# Altium footprint library Custom_Case.PcbLib: 350 footprints (part 14 of 22)
Each footprint in its own frame and in the unit in brackets; x right, y up, seen from the top. Pads: shape width x height; smd on the part's side, far side on the other; paste and mask are expansions set on the pad; w line width, h text height; cw(c..) or ccw(c..) is an arc to the next point about the centre after c.
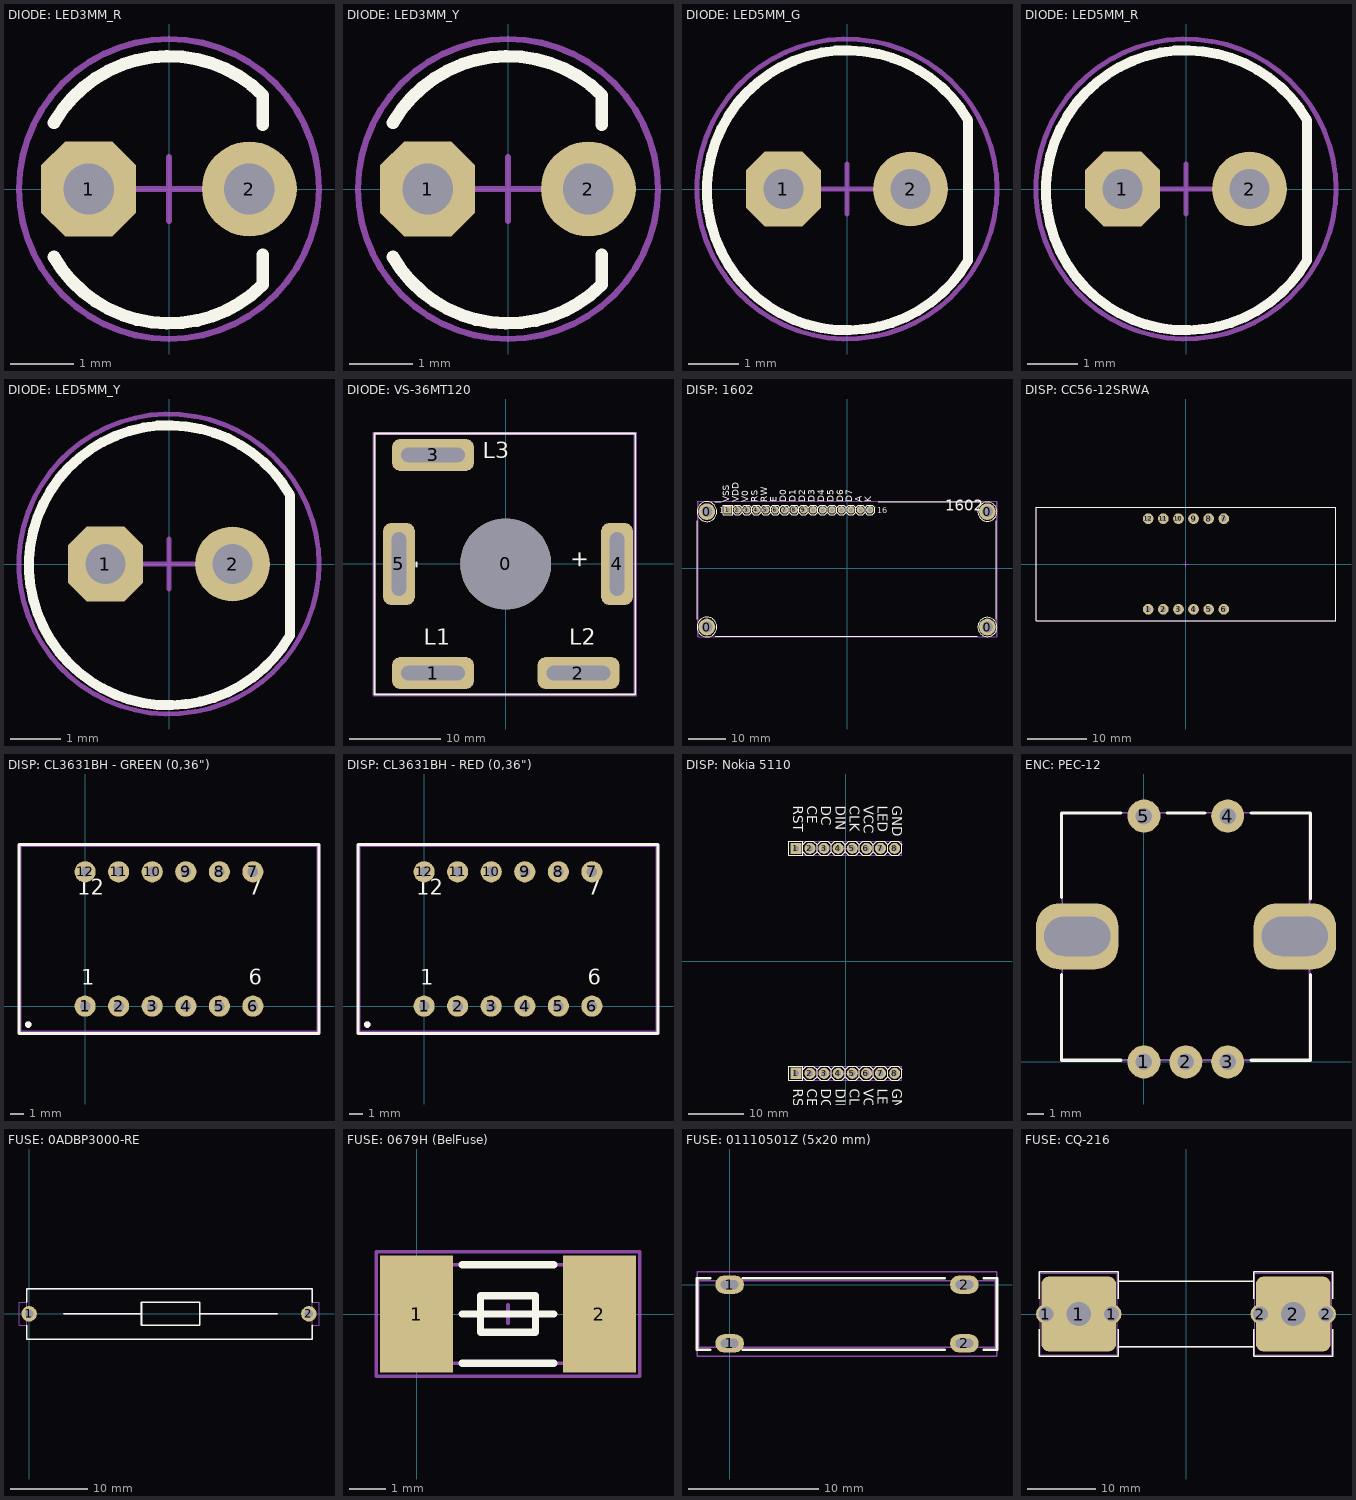
[diagram p13: the footprints below, top view; thin cyan lines are the x and y axes]

## DIODE: LED3MM_R [mm] "Red Leaded Led, 3 mm"
height 12
pads (2):
  oct 1.5x1.5 hole 0.8: 1(-1.27,0)
  round 1.5 hole 0.8: 2(1.27,0)
Top Overlay:
  lines w0.2: -1.819,-1.075 ccw(c0,-0.025) 1.485,-1.51 1.485,-1.04 ; -1.819,1.05 cw(c0,0) 1.485,1.485 1.485,1.015
Top Assy:
  circle w0.1: c0,0 r2.372
Size Area:
  circle w0.1: c0,0 r2.372
  lines w0.1: -0.5,0 0.5,0 ; 0,-0.5 0,0.5
3D body "3mm_led_red.STEP": height 12, standoff -1, extent -2,-2 2,2

## DIODE: LED3MM_Y [mm] "Yellow Leaded Led, 3 mm"
height 12
pads (2):
  oct 1.5x1.5 hole 0.8: 1(-1.27,0)
  round 1.5 hole 0.8: 2(1.27,0)
Top Overlay:
  lines w0.2: 1.485,-1.51 cw(c0,-0.025) -1.819,-1.075 ccw(c0,-0.025) 1.485,-1.51 ; 1.485,-1.51 1.485,-1.04 1.485,-1.51 ; 1.485,1.485 ccw(c0,0) -1.819,1.05 cw(c0,0) 1.485,1.485 ; 1.485,1.485 1.485,1.015 1.485,1.485
Top Assy:
  circle w0.1: c0,0 r2.372
Size Area:
  circle w0.1: c0,0 r2.372
  lines w0.1: -0.5,0 0.5,0 ; 0,-0.5 0,0.5
3D body "3mm_led_yell.STEP": height 12, standoff -1, extent -2,-2 2,2

## DIODE: LED5MM_G [mm] "Green Leaded Led, 5 mm"
height 12
pads (2):
  oct 1.5x1.5 hole 0.8: 1(-1.27,0)
  round 1.5 hole 0.8: 2(1.27,0)
Top Overlay:
  lines w0.2: 2.425,-1.425 cw(c0,-0.025) 2.425,1.375 2.425,-1.425
Top Assy:
  circle w0.1: c0,0 r3
Size Area:
  circle w0.1: c0,0 r3
  lines w0.1: -0.5,0 0.5,0 ; 0,-0.5 0,0.5
3D body "5mm_led_grn.STEP": height 14.5, standoff -1, extent -3,-3 3,3

## DIODE: LED5MM_R [mm] "Red Leaded Led, 5 mm"
height 12
pads (2):
  oct 1.5x1.5 hole 0.8: 1(-1.27,0)
  round 1.5 hole 0.8: 2(1.27,0)
Top Overlay:
  lines w0.2: 2.425,-1.425 cw(c0,-0.025) 2.425,1.375 2.425,-1.425
Top Assy:
  circle w0.1: c0,0 r3
Size Area:
  circle w0.1: c0,0 r3
  lines w0.1: -0.5,0 0.5,0 ; 0,-0.5 0,0.5
3D body "5mm_led_red.STEP": height 14.5, standoff -1, extent -3,-3 3,3

## DIODE: LED5MM_Y [mm] "Yellow Leaded Led, 5 mm"
height 12
pads (2):
  oct 1.5x1.5 hole 0.8: 1(-1.27,0)
  round 1.5 hole 0.8: 2(1.27,0)
Top Overlay:
  lines w0.2: 2.425,-1.425 cw(c0,-0.025) 2.425,1.375 2.425,-1.425
Top Assy:
  circle w0.1: c0,0 r3
Size Area:
  circle w0.1: c0,0 r3
  lines w0.1: -0.5,0 0.5,0 ; 0,-0.5 0,0.5
3D body "5mm_led_yell.STEP": height 14.5, standoff -1, extent -3,-3 3,3

## DIODE: VS-36MT120 [mm]
pads (6):
  round 10 hole 10: 0(0,0)
  rrect50% 9x3.5 hole 1.6 slot 7 at 0 deg: 1(-8,-12) 2(8,-12) 3(-8,12)
  rrect50% 3.5x9 hole 1.6 slot 7 at 90 deg: 4(12.25,0) 5(-11.75,0)
Top Overlay:
  lines w0.2: -14.45,-14.35 14.25,-14.35 14.25,14.35 -14.45,14.35 -14.45,-14.35
  text "L1" at -9,-9.5 h3
  text "L3" at -2.5,11 h3
  text "L2" at 7,-9.5 h3
  text "+" at 9.5,-0.5 h3
  text "-" at -8.5,-0.5 h3
Top Assy:
  lines w0.1: -14.35,-14.25 -14.35,14.25 14.15,14.25 14.15,-14.25 -14.35,-14.25
Size Area:
  lines w0.1: -14.6,-14.5 -14.6,14.5 14.4,14.5 14.4,-14.5 -14.6,-14.5
3D body "D-63.stp": height 16, standoff -6, extent -14.35,-14.25 14.15,14.25

## DISP: 1602 [mm]
pads (20):
  round 4.5 hole 3: 0(-37.655,-15.723) 0(-37.655,15.265) 0(37.655,-15.723) 0(37.655,15.265)
  rect 2x2 hole 1.1: 1(-32.017,15.723)
  round 2 hole 1.1: 2(-29.477,15.723) 3(-26.937,15.723) 4(-24.397,15.723) 5(-21.857,15.723) 6(-19.317,15.723) 7(-16.777,15.723) 8(-14.237,15.723) 9(-11.697,15.723) 10(-9.157,15.723) 11(-6.617,15.723) 12(-4.077,15.723) 13(-1.537,15.723) 14(1.003,15.723) 15(3.543,15.723) 16(6.083,15.723)
Top Overlay:
  circle w0.254: c-37.655,15.265 r2.667
  circle w0.254: c-37.655,-15.723 r2.667
  circle w0.254: c37.655,-15.723 r2.572
  circle w0.254: c37.655,15.265 r2.572
  lines w0.2: -30.747,15.088 -30.112,14.453 -28.842,14.453 -28.207,15.088 ; -30.747,16.358 -30.112,16.993 -28.842,16.993 -28.207,16.358 ; -28.207,15.088 -28.207,16.358 ; -28.207,15.088 -27.572,14.453 -26.302,14.453 -25.667,15.088 ; -28.207,16.358 -27.572,16.993 -26.302,16.993 -25.667,16.358 ; -25.667,15.088 -25.667,16.358 ; -25.667,15.088 -25.032,14.453 -23.762,14.453 -23.127,15.088 ; -25.667,16.358 -25.032,16.993 -23.762,16.993 -23.127,16.358 ; -23.127,15.088 -23.127,16.358 ; -23.127,15.088 -22.492,14.453 -21.222,14.453 -20.587,15.088 ; -23.127,16.358 -22.492,16.993 -21.222,16.993 -20.587,16.358 ; -20.587,15.088 -19.952,14.453 -18.682,14.453 -18.047,15.088 ; -20.587,15.088 -20.587,16.358 ; -20.587,16.358 -19.952,16.993 -18.682,16.993 -18.047,16.358 ; -18.047,15.088 -18.047,16.358 ; -18.047,15.088 -17.412,14.453 -16.142,14.453 -15.507,15.088 ; -18.047,16.358 -17.412,16.993 -16.142,16.993 -15.507,16.358 ; -15.507,15.088 -14.872,14.453 -13.602,14.453 -12.967,15.088 ; -15.507,15.088 -15.507,16.358 ; -15.507,16.358 -14.872,16.993 -13.602,16.993 -12.967,16.358 ; -12.967,15.088 -12.332,14.453 -11.062,14.453 -10.427,15.088 ; -12.967,15.088 -12.967,16.358 ; -12.967,16.358 -12.332,16.993 -11.062,16.993 -10.427,16.358 ; -10.427,15.088 -9.792,14.453 -8.522,14.453 -7.887,15.088 ; -10.427,15.088 -10.427,16.358 ; -10.427,16.358 -9.792,16.993 -8.522,16.993 -7.887,16.358 ; -7.887,15.088 -7.887,16.358 ; -7.887,15.088 -7.252,14.453 -5.982,14.453 -5.347,15.088 ; -7.887,16.358 -7.252,16.993 -5.982,16.993 -5.347,16.358 ; -5.347,15.088 -4.712,14.453 -3.442,14.453 -2.807,15.088 ; -5.347,15.088 -5.347,16.358 ; -5.347,16.358 -4.712,16.993 -3.442,16.993 -2.807,16.358 ; -2.807,15.088 -2.172,14.453 -0.902,14.453 -0.267,15.088 ; -2.807,15.088 -2.807,16.358 ; -2.807,16.358 -2.172,16.993 -0.902,16.993 -0.267,16.358 ; -0.267,15.088 -0.267,16.358 ; -0.267,15.088 0.368,14.453 1.638,14.453 2.273,15.088 ; -0.267,16.358 0.368,16.993 1.638,16.993 2.273,16.358 ; 2.273,15.088 2.908,14.453 4.178,14.453 4.813,15.088 ; 2.273,15.088 2.273,16.358 ; 2.273,16.358 2.908,16.993 4.178,16.993 4.813,16.358 ; 4.813,15.088 4.813,16.358 ; 4.813,15.088 5.448,14.453 6.718,14.453 7.353,15.088 7.353,16.358 6.718,16.993 5.448,16.993 4.813,16.358 ; -33.287,14.453 -33.287,16.993 -30.747,16.993 -30.747,14.453 -33.287,14.453
  lines w0.254: -40.195,-13.564 -40.195,12.852 ; -35.623,17.932 -33.846,17.932 ; -35.369,-18.136 34.989,-18.136 ; 8.319,17.932 35.75,17.932 ; 40.069,-13.564 40.069,12.852
  text "1602" at 26.305,14.406 h5
  text "K" at 7.172,17.798 h3
  text "A" at 4.632,17.798 h3
  text "D7" at 2.093,17.798 h3
  text "D6" at -0.447,17.798 h3
  text "D5" at -2.987,17.798 h3
  text "D4" at -5.527,17.798 h3
  text "D3" at -8.067,17.798 h3
  text "D2" at -10.607,17.798 h3
  text "D1" at -13.147,17.798 h3
  text "D0" at -15.687,17.798 h3
  text "E" at -18.227,17.798 h3
  text "RW" at -20.767,17.798 h3
  text "RS" at -23.307,17.798 h3
  text "V0" at -25.847,17.798 h3
  text "VDD" at -28.387,17.798 h3
  text "VSS" at -30.927,17.798 h3
  text "16" at 8.064,14.884 h1.52
  text "1" at -34.353,14.884 h1.52
Top Assy:
  lines w0.1: -40.132,-18.288 40.132,-18.288 40.132,18.034 -40.132,18.034 -40.132,-18.288
Size Area:
  lines w0.05: -40.132,-18.288 40.132,-18.288 40.132,18.034 -40.132,18.034 -40.132,-18.288
  lines w0.1: -13.467,15.723 -12.467,15.723 ; -12.967,15.223 -12.967,16.223
3D body "PLS-16.STEP": height 8.54, standoff -3, extent -33.287,14.453 7.353,16.993
3D body "User Library-LCD1602.step": height 14.05, standoff 2, extent -40.013,-18.195 39.987,17.805

## DISP: CC56-12SRWA [mm]
height 8.1
pads (12):
  round 1.8 hole 0.9: 1(-6.35,-7.62) 2(-3.81,-7.62) 3(-1.27,-7.62) 4(1.27,-7.62) 5(3.81,-7.62) 6(6.35,-7.62) 7(6.35,7.62) 8(3.81,7.62) 9(1.27,7.62) 10(-1.27,7.62) 11(-3.81,7.62) 12(-6.35,7.62)
Top Overlay:
  lines w0.2: -25.2,-9.5 25.2,-9.5 25.2,9.5 -25.2,9.5 -25.2,-9.5
Top Assy:
  lines w0.1: -25.2,-9.5 25.2,-9.5 25.2,9.5 -25.2,9.5 -25.2,-9.5
Size Area:
  lines w0.1: -0.5,0 0.5,0 ; 0,-0.5 0,0.5 ; -25.2,-9.5 -25.2,9.5 25.2,9.5 25.2,-9.5 -25.2,-9.5
3D body "User Library-C-564 (7 segment 4 digit LED display).STEP": height 8, standoff -6.2, extent -25.2,-9.5 25.2,9.5

## DISP: CL3631BH - GREEN (0,36") [mm]
pads (14):
  round 1.6 hole 0.8: 1(0,0) 2(2.54,0) 3(5.08,0) 4(7.62,0) 5(10.16,0) 6(12.7,0) 7(12.7,10.16) 8(10.16,10.16) 9(7.62,10.16) 10(5.08,10.16) 11(2.54,10.16) 12(0,10.16)
  round 0.5 on Mech1: ""(-4.3,-1.4)
  round 0.5 on Top Overlay: ""(-4.3,-1.4)
Top Overlay:
  lines w0.2: -5,-2.075 -5,12.225 17.7,12.225 17.7,-2.075 -5,-2.075
  text "1" at -0.3,1.2 h2
  text "6" at 12.4,1.2 h2
  text "7" at 12.4,8 h2
  text "12" at -0.6,8 h2
Top Assy:
  lines w0.1: -4.85,-1.92 -4.85,12.08 17.55,12.08 17.55,-1.92 -4.85,-1.92
Size Area:
  lines w0.1: -4.95,-2.025 -4.95,12.175 17.65,12.175 17.65,-2.025 -4.95,-2.025
3D body "User Library-3631_Green_jam.STEP": height 7.1, standoff -5.5, extent -4.85,-1.92 17.55,12.08

## DISP: CL3631BH - RED (0,36") [mm]
pads (14):
  round 1.6 hole 0.8: 1(0,0) 2(2.54,0) 3(5.08,0) 4(7.62,0) 5(10.16,0) 6(12.7,0) 7(12.7,10.16) 8(10.16,10.16) 9(7.62,10.16) 10(5.08,10.16) 11(2.54,10.16) 12(0,10.16)
  round 0.5 on Mech1: ""(-4.3,-1.4)
  round 0.5 on Top Overlay: ""(-4.3,-1.4)
Top Overlay:
  lines w0.2: -5,-2.075 -5,12.225 17.7,12.225 17.7,-2.075 -5,-2.075
  text "1" at -0.3,1.2 h2
  text "6" at 12.4,1.2 h2
  text "7" at 12.4,8 h2
  text "12" at -0.6,8 h2
Top Assy:
  lines w0.1: -4.85,-1.92 -4.85,12.08 17.55,12.08 17.55,-1.92 -4.85,-1.92
Size Area:
  lines w0.1: -4.95,-2.025 -4.95,12.175 17.65,12.175 17.65,-2.025 -4.95,-2.025
3D body "User Library-3631_Red_jam.STEP": height 7.1, standoff -5.5, extent -4.85,-1.92 17.55,12.08

## DISP: Nokia 5110 [mm]
pads (16):
  rect 2x2 hole 1.1: 1(-8.966,-20.168) 1(-8.966,20.32)
  round 2 hole 1.1: 2(-6.426,-20.168) 2(-6.426,20.32) 3(-3.886,-20.168) 3(-3.886,20.32) 4(-1.346,-20.168) 4(-1.346,20.32) 5(1.194,-20.168) 5(1.194,20.32) 6(3.734,-20.168) 6(3.734,20.32) 7(6.274,-20.168) 7(6.274,20.32) 8(8.814,-20.168) 8(8.814,20.32)
Top Overlay:
  lines w0.2: -7.696,-20.803 -7.061,-21.438 -5.791,-21.438 -5.156,-20.803 ; -7.696,-19.533 -7.061,-18.898 -5.791,-18.898 -5.156,-19.533 ; -7.696,19.685 -7.061,19.05 -5.791,19.05 -5.156,19.685 ; -7.696,20.955 -7.061,21.59 -5.791,21.59 -5.156,20.955 ; -5.156,-20.803 -5.156,-19.533 ; -5.156,-20.803 -4.521,-21.438 -3.251,-21.438 -2.616,-20.803 ; -5.156,-19.533 -4.521,-18.898 -3.251,-18.898 -2.616,-19.533 ; -5.156,19.685 -5.156,20.955 ; -5.156,19.685 -4.521,19.05 -3.251,19.05 -2.616,19.685 ; -5.156,20.955 -4.521,21.59 -3.251,21.59 -2.616,20.955 ; -2.616,-20.803 -2.616,-19.533 ; -2.616,-20.803 -1.981,-21.438 -0.711,-21.438 -0.076,-20.803 ; -2.616,-19.533 -1.981,-18.898 -0.711,-18.898 -0.076,-19.533 ; -2.616,19.685 -2.616,20.955 ; -2.616,19.685 -1.981,19.05 -0.711,19.05 -0.076,19.685 ; -2.616,20.955 -1.981,21.59 -0.711,21.59 -0.076,20.955 ; -0.076,-20.803 -0.076,-19.533 ; -0.076,-20.803 0.559,-21.438 1.829,-21.438 2.464,-20.803 ; -0.076,-19.533 0.559,-18.898 1.829,-18.898 2.464,-19.533 ; -0.076,19.685 -0.076,20.955 ; -0.076,19.685 0.559,19.05 1.829,19.05 2.464,19.685 ; -0.076,20.955 0.559,21.59 1.829,21.59 2.464,20.955 ; 2.464,-20.803 3.099,-21.438 4.369,-21.438 5.004,-20.803 ; 2.464,-20.803 2.464,-19.533 ; 2.464,-19.533 3.099,-18.898 4.369,-18.898 5.004,-19.533 ; 2.464,19.685 3.099,19.05 4.369,19.05 5.004,19.685 ; 2.464,19.685 2.464,20.955 ; 2.464,20.955 3.099,21.59 4.369,21.59 5.004,20.955 ; 5.004,-20.803 5.004,-19.533 ; 5.004,-20.803 5.639,-21.438 6.909,-21.438 7.544,-20.803 ; 5.004,-19.533 5.639,-18.898 6.909,-18.898 7.544,-19.533 ; 5.004,19.685 5.004,20.955 ; 5.004,19.685 5.639,19.05 6.909,19.05 7.544,19.685 ; 5.004,20.955 5.639,21.59 6.909,21.59 7.544,20.955 ; 7.544,-20.803 8.179,-21.438 9.449,-21.438 10.084,-20.803 10.084,-19.533 9.449,-18.898 8.179,-18.898 7.544,-19.533 ; 7.544,-20.803 7.544,-19.533 ; 7.544,19.685 8.179,19.05 9.449,19.05 10.084,19.685 10.084,20.955 9.449,21.59 8.179,21.59 7.544,20.955 ; 7.544,19.685 7.544,20.955 ; -10.236,-21.438 -10.236,-18.898 -7.696,-18.898 -7.696,-21.438 -10.236,-21.438 ; -10.236,19.05 -10.236,21.59 -7.696,21.59 -7.696,19.05 -10.236,19.05
  text "GND" at 7.716,28 h3
  text "LED" at 5.176,28 h3
  text "DIN" at -2.444,28 h3
  text "VCC" at 2.636,28 h3
  text "CLK" at 0.096,28 h3
  text "DC" at -4.984,28 h3
  text "CE" at -7.524,28 h3
  text "RST" at -10.064,28 h3
  text "GND" at 7.716,-23 h3
  text "LED" at 5.176,-23 h3
  text "DIN" at -2.444,-23 h3
  text "VCC" at 2.636,-23 h3
  text "CLK" at 0.096,-23 h3
  text "DC" at -4.984,-23 h3
  text "CE" at -7.524,-23 h3
  text "RST" at -10.064,-23 h3
Bottom Overlay:
  text "LED" at 5.176,-28 h3
  text "DIN" at -2.444,-28 h3
  text "RST" at -10.064,-28 h3
  text "GND" at 7.716,-28 h3
  text "VCC" at 2.636,-28 h3
  text "CLK" at 0.096,-28 h3
  text "DC" at -4.984,-28 h3
  text "CE" at -7.524,-28 h3
  text "LED" at 5.209,23 h3
  text "DIN" at -2.411,23 h3
  text "RST" at -10.031,23 h3
  text "GND" at 7.749,23 h3
  text "VCC" at 2.669,23 h3
  text "CLK" at 0.129,23 h3
  text "DC" at -4.951,23 h3
  text "CE" at -7.491,23 h3
Top Assy:
  lines w0.1: -7.696,-20.803 -7.061,-21.438 -5.791,-21.438 -5.156,-20.803 ; -7.696,-19.533 -7.061,-18.898 -5.791,-18.898 -5.156,-19.533 ; -7.696,19.685 -7.061,19.05 -5.791,19.05 -5.156,19.685 ; -7.696,20.955 -7.061,21.59 -5.791,21.59 -5.156,20.955 ; -5.156,-20.803 -4.521,-21.438 -3.251,-21.438 -2.616,-20.803 ; -5.156,-20.803 -5.156,-19.533 ; -5.156,-19.533 -4.521,-18.898 -3.251,-18.898 -2.616,-19.533 ; -5.156,19.685 -4.521,19.05 -3.251,19.05 -2.616,19.685 ; -5.156,19.685 -5.156,20.955 ; -5.156,20.955 -4.521,21.59 -3.251,21.59 -2.616,20.955 ; -2.616,-20.803 -1.981,-21.438 -0.711,-21.438 -0.076,-20.803 ; -2.616,-20.803 -2.616,-19.533 ; -2.616,-19.533 -1.981,-18.898 -0.711,-18.898 -0.076,-19.533 ; -2.616,19.685 -1.981,19.05 -0.711,19.05 -0.076,19.685 ; -2.616,19.685 -2.616,20.955 ; -2.616,20.955 -1.981,21.59 -0.711,21.59 -0.076,20.955 ; -0.076,-20.803 0.559,-21.438 1.829,-21.438 2.464,-20.803 ; -0.076,-20.803 -0.076,-19.533 ; -0.076,-19.533 0.559,-18.898 1.829,-18.898 2.464,-19.533 ; -0.076,19.685 0.559,19.05 1.829,19.05 2.464,19.685 ; -0.076,19.685 -0.076,20.955 ; -0.076,20.955 0.559,21.59 1.829,21.59 2.464,20.955 ; 2.464,-20.803 2.464,-19.533 ; 2.464,-20.803 3.099,-21.438 4.369,-21.438 5.004,-20.803 ; 2.464,-19.533 3.099,-18.898 4.369,-18.898 5.004,-19.533 ; 2.464,19.685 2.464,20.955 ; 2.464,19.685 3.099,19.05 4.369,19.05 5.004,19.685 ; 2.464,20.955 3.099,21.59 4.369,21.59 5.004,20.955 ; 5.004,-20.803 5.639,-21.438 6.909,-21.438 7.544,-20.803 ; 5.004,-20.803 5.004,-19.533 ; 5.004,-19.533 5.639,-18.898 6.909,-18.898 7.544,-19.533 ; 5.004,19.685 5.639,19.05 6.909,19.05 7.544,19.685 ; 5.004,19.685 5.004,20.955 ; 5.004,20.955 5.639,21.59 6.909,21.59 7.544,20.955 ; 7.544,-20.803 7.544,-19.533 ; 7.544,-20.803 8.179,-21.438 9.449,-21.438 10.084,-20.803 10.084,-19.533 9.449,-18.898 8.179,-18.898 7.544,-19.533 ; 7.544,19.685 7.544,20.955 ; 7.544,19.685 8.179,19.05 9.449,19.05 10.084,19.685 10.084,20.955 9.449,21.59 8.179,21.59 7.544,20.955 ; -10.236,-21.438 -7.696,-21.438 -7.696,-18.898 -10.236,-18.898 -10.236,-21.438 ; -10.236,19.05 -7.696,19.05 -7.696,21.59 -10.236,21.59 -10.236,19.05
Size Area:
  lines w0.05: -10.236,-21.438 10.084,-21.438 10.084,-18.898 -10.236,-18.898 -10.236,-21.438 ; -10.236,19.05 10.084,19.05 10.084,21.59 -10.236,21.59 -10.236,19.05
  lines w0.1: -0.576,-20.168 0.424,-20.168 ; -0.576,20.32 0.424,20.32 ; -0.076,-20.668 -0.076,-19.668 ; -0.076,19.82 -0.076,20.82
3D body "User Library-LCD5110R-1.STEP": height 7.29, standoff 1.39, extent -22.576,-22.424 22.424,22.576
3D body "PLS-8.STEP": height 8.54, standoff -3, extent -10.236,-21.438 10.084,-18.898
3D body "PLS-8.STEP": height 8.54, standoff -3, extent -10.236,19.05 10.084,21.59

## ENC: PEC-12 [mm]
pads (7):
  round 2 hole 1: 1(0,0) 2(2.54,0) 3(5.08,0) 4(5.08,14.922) 5(0,14.922)
  rrect70% 5x4 hole 2.4 slot 4 at 0 deg: ""(-4.05,7.625) ""(9.15,7.625)
Top Overlay:
  lines w0.2: -5,5.3 -5,0.1 -1.4,0.1 ; -5,10 -5,15.1 -1.4,15.1 ; 1.4,15.1 3.7,15.1 ; 6.5,0.1 10.1,0.1 10.1,5.3 ; 6.5,15.1 10.1,15.1 10.1,9.9
Top Assy:
  lines w0.1: -4.966,0.12 -4.966,15.12 10.046,15.12 10.046,0.12 -4.966,0.12
3D body "User Library-rotacijski enkoder.STEP": height 16.5, standoff -4.53, extent -4.964,0.12 10.044,15.12

## FUSE: 0ADBP3000-RE [mm]
pads (2):
  round 2 hole 1.1: 1(0,0) 2(36.1,0)
Top Overlay:
  lines w0.2: -0.31,-1.5 -0.31,-3.3 36.51,-3.3 36.51,-1.5 ; -0.31,1.5 -0.31,3.25 36.51,3.25 36.51,1.5 ; 4.5,0 14.5,0 ; 22,0 32,0 ; 14.5,0 14.5,1.5 22,1.5 22,-1.5 14.5,-1.5 14.5,0
Top Assy:
  lines w0.1: 4.5,0 14.5,0 ; 22,0 32,0 ; 14.5,0 14.5,-1.5 22,-1.5 22,1.5 14.5,1.5 14.5,0 ; -0.31,-3.3 36.51,-3.3 36.51,3.25 -0.31,3.25 -0.31,-3.3
Size Area:
  lines w0.1: -1.3,-1.5 -1.3,1.5 -0.31,1.5 -0.31,3.25 36.51,3.25 36.51,1.5 37.4,1.5 37.4,-1.5 36.51,-1.5 36.51,-3.3 -0.31,-3.3 -0.31,-1.5 -1.3,-1.5
3D body "fuse.STEP": height 6.78, standoff -1.8, extent -0.31,-3.3 36.51,3.25

## FUSE: 0679H (BelFuse) [mm]
pads (2):
  rect 2x3.2 smd mask+0.075: 1(0,0) 2(5,0)
Top Overlay:
  lines w0.2: 1.25,-1.35 3.75,-1.35 ; 1.25,0 3.75,0 ; 1.25,1.35 3.75,1.35 ; 1.75,-0.5 1.75,0.5 3.25,0.5 3.25,-0.5 1.75,-0.5
Top Assy:
  lines w0.1: -0.55,-1.35 -0.55,1.35 5.55,1.35 5.55,-1.35 -0.55,-1.35
Size Area:
  lines w0.1: 2.25,0 2.75,0 ; 2.5,-0.25 2.5,0.25 ; -1.1,-1.7 6.1,-1.7 6.1,1.7 -1.1,1.7 -1.1,-1.7
3D body "User Library-fuse smd.STEP": height 2.69, standoff 0, extent -0.55,-1.35 5.55,1.34

## FUSE: 01110501Z (5x20 mm) [mm]
pads (4):
  oval 2.2x1.4 hole 0.7 slot 1.35 at 0 deg: 1(0,-4.5) 1(0,0) 2(18,-4.5) 2(18,0)
Top Overlay:
  lines w0.2: -1.5,-5 -2.5,-5 -2.5,0.5 -1.5,0.5 ; 1,-5 16.5,-5 ; 1,0.5 16.5,0.5 ; 19.5,-5 20.5,-5 20.5,0.5 19.5,0.5
Top Assy:
  lines w0.1: 20.35,-4.8 -2.35,-4.8 -2.35,0.3 20.35,0.3 ; 20.35,-4.8 20.35,0.3 ; 20.35,-4.8 20.35,-4.8 ; 20.35,0.3 20.35,0.3
Size Area:
  lines w0.1: -2.5,-5.5 20.5,-5.5 20.5,1 -2.5,1 -2.5,-5.5
3D body "User Library-FUSIVEL.STEP": height 8.5, standoff 3.5, extent -1,-4.7 19,0.3
3D body "01110501Z.STEP": height 7.25, standoff -3.1, extent 15.55,-4.8 20.35,0.3
3D body "01110501Z.STEP": height 7.25, standoff -3.1, extent -2.35,-4.8 2.45,0.3

## FUSE: CQ-216 [mm]
pads (6):
  round 2.9 hole 2.2: 1(-20.65,0) 1(-10.95,0) 2(10.95,0) 2(20.65,0)
  rrect20% 11x11 / inner round 5.5 / far side round 5.5 hole 3.6: 1(-15.8,0) 2(15.8,0)
Top Overlay:
  lines w0.2: -21.65,-2.25 -21.65,-6.2 -9.95,-6.2 -9.95,-2.25 ; -21.65,2.25 -21.65,6.2 -9.95,6.2 -9.95,2.25 ; -9.95,-4.8 9.95,-4.8 ; -9.95,4.8 9.95,4.8 ; 9.95,-2.25 9.95,-6.2 21.65,-6.2 21.65,-2.25 ; 9.95,2.25 9.95,6.2 21.65,6.2 21.65,2.25
Mechanical 14:
  lines w0.1: -10.15,-4.8 10.15,-4.8 ; -10.15,4.8 10.15,4.8 ; -21.45,-6 -21.45,6 -10.15,6 -10.15,-6 -21.45,-6 ; 10.15,-6 10.15,6 21.45,6 21.45,-6 10.15,-6
3D body "FUSH_BUSSMANN_1A3400-09.stp": height 18, standoff -3.8, extent 10.25,-5.948 21.35,5.948
3D body "FUSH_BUSSMANN_1A3400-09.stp": height 18, standoff -3.8, extent -21.35,-5.948 -10.25,5.948
3D body "FUSE_10X38_H_Part1.stp": height 17.3, standoff 7, extent -19,-5.15 19,5.15
3D body "FUSE_10X38_H_Part2.stp": height 17, standoff 7.3, extent -9,-4.85 9,4.85